# Altium footprint library 1.20-电感.PcbLib: 64 footprints (part 3 of 4)
Each footprint in its own frame and in the unit in brackets; x right, y up, seen from the top. Pads: shape width x height; smd on the part's side, far side on the other; paste and mask are expansions set on the pad; w line width, h text height; cw(c..) or ccw(c..) is an arc to the next point about the centre after c.
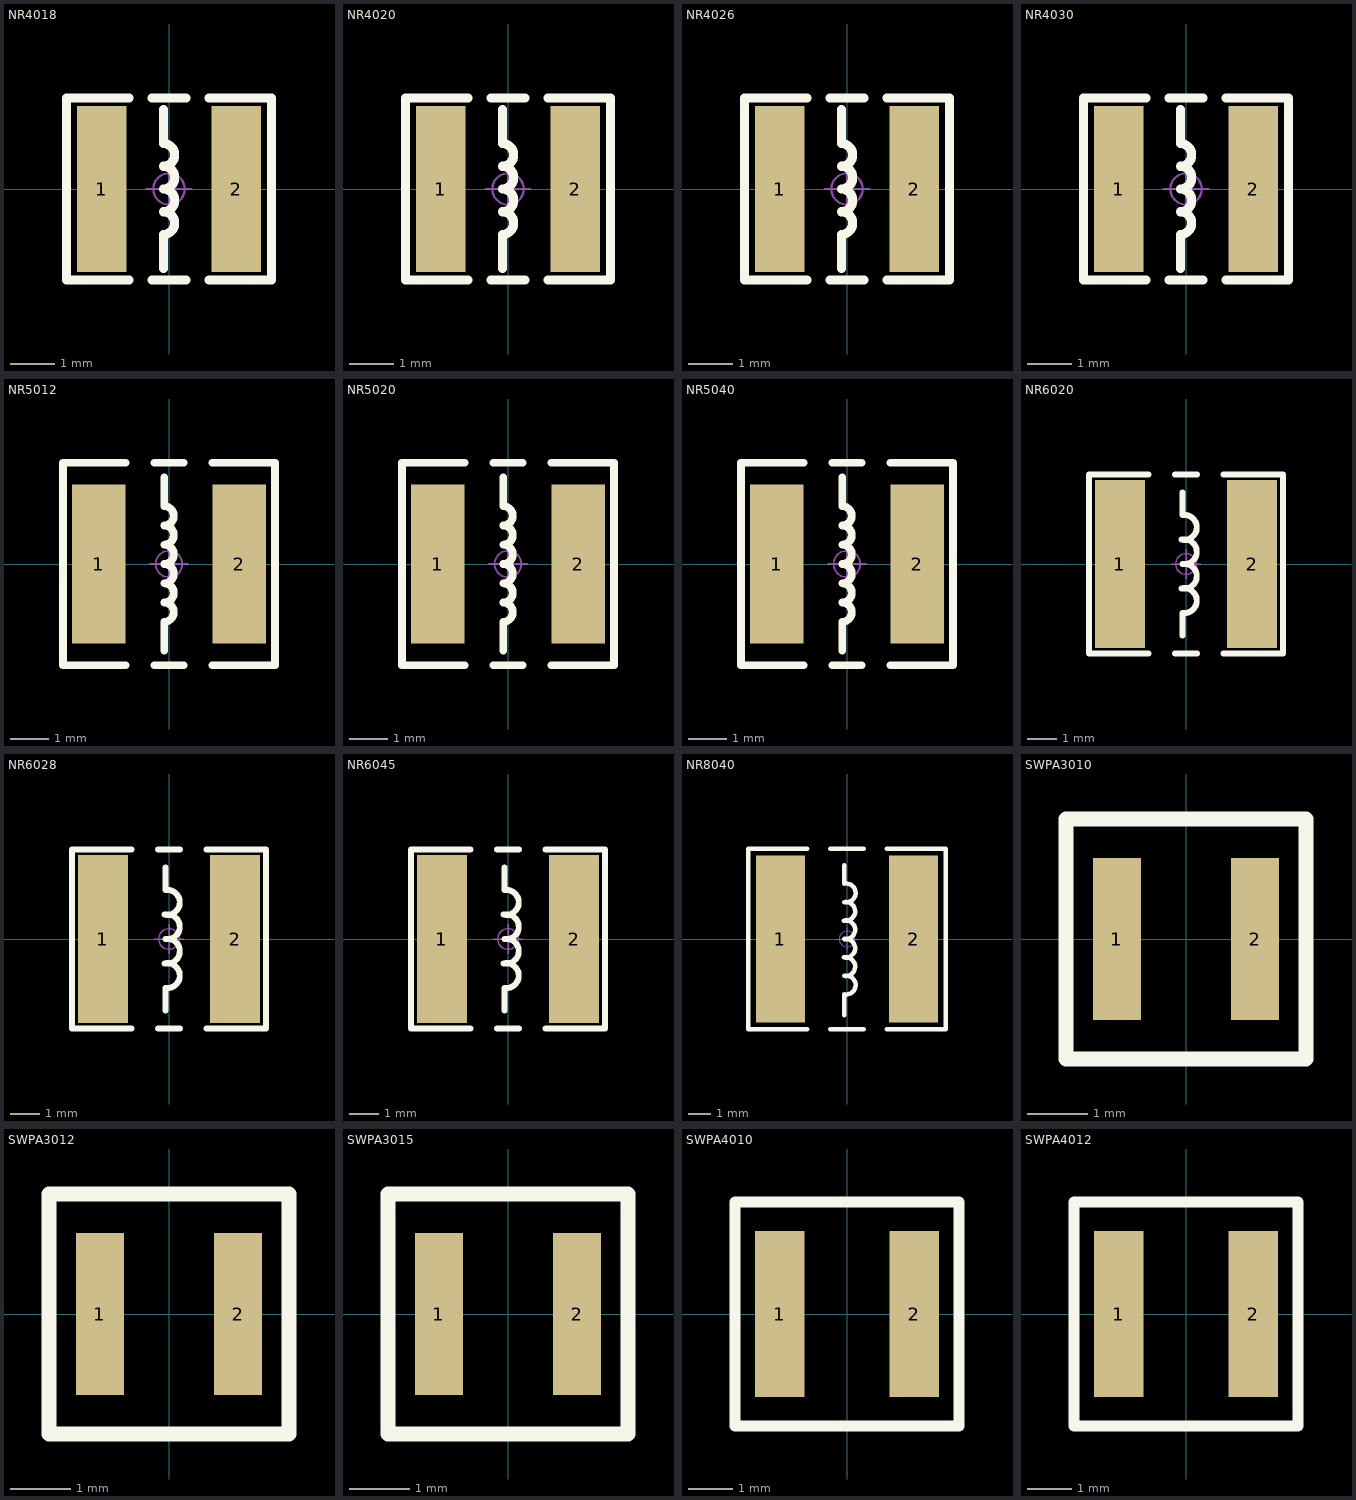
[diagram p2: the footprints below, top view; thin cyan lines are the x and y axes]

## NR4018 [mm] "4.0mm*4.0mm*1.8mm(长*宽*高）      [ PCB学习群514746572 ]"
pads (2):
  rect 1.1x3.7 smd: 1(-1.5,0) 2(1.5,0)
Top Overlay:
  lines w0.203: -0.889,-2.032 -2.286,-2.032 -2.286,2.032 -0.889,2.032 ; -0.381,-2.032 0.381,-2.032 ; -0.381,2.032 0.381,2.032 ; -0.127,-1.778 -0.127,-1.016 ccw(c-0.127,-0.762) -0.127,-0.508 ccw(c-0.127,-0.254) -0.127,0 ccw(c-0.127,0.254) -0.127,0.508 ccw(c-0.127,0.762) -0.127,1.016 -0.127,1.778 ; 0.889,-2.032 2.286,-2.032 2.286,2.032 0.889,2.032
Mechanical 15:
  circle w0.05: c0,0 r0.35
  lines w0.05: -0.5,0 0.5,0 ; 0,-0.5 0,0.5
3D body "NR4018.STEP": height 1.9, standoff 0, extent -2,-2 2,2

## NR4020 [mm] "4.0mm*4.0mm*2.0mm(长*宽*高）      [ PCB学习群514746572 ]"
pads (2):
  rect 1.1x3.7 smd: 1(-1.5,0) 2(1.5,0)
Top Overlay:
  lines w0.203: -0.889,-2.032 -2.286,-2.032 -2.286,2.032 -0.889,2.032 ; -0.381,-2.032 0.381,-2.032 ; -0.381,2.032 0.381,2.032 ; -0.127,-1.778 -0.127,-1.016 ccw(c-0.127,-0.762) -0.127,-0.508 ccw(c-0.127,-0.254) -0.127,0 ccw(c-0.127,0.254) -0.127,0.508 ccw(c-0.127,0.762) -0.127,1.016 -0.127,1.778 ; 0.889,-2.032 2.286,-2.032 2.286,2.032 0.889,2.032
Mechanical 15:
  circle w0.05: c0,0 r0.35
  lines w0.05: -0.5,0 0.5,0 ; 0,-0.5 0,0.5
3D body "NR4020.STEP": height 2.1, standoff 0, extent -2,-2 2,2

## NR4026 [mm] "4.0mm*4.0mm*2.6mm(长*宽*高）      [ PCB学习群514746572 ]"
pads (2):
  rect 1.1x3.7 smd: 1(-1.5,0) 2(1.5,0)
Top Overlay:
  lines w0.203: -0.889,-2.032 -2.286,-2.032 -2.286,2.032 -0.889,2.032 ; -0.381,-2.032 0.381,-2.032 ; -0.381,2.032 0.381,2.032 ; -0.127,-1.778 -0.127,-1.016 ccw(c-0.127,-0.762) -0.127,-0.508 ccw(c-0.127,-0.254) -0.127,0 ccw(c-0.127,0.254) -0.127,0.508 ccw(c-0.127,0.762) -0.127,1.016 -0.127,1.778 ; 0.889,-2.032 2.286,-2.032 2.286,2.032 0.889,2.032
Mechanical 15:
  circle w0.05: c0,0 r0.35
  lines w0.05: -0.5,0 0.5,0 ; 0,-0.5 0,0.5
3D body "NR4026.STEP": height 2.7, standoff 0, extent -2,-2 2,2

## NR4030 [mm] "4.0mm*4.0mm*3.0mm(长*宽*高）      [ PCB学习群514746572 ]"
pads (2):
  rect 1.1x3.7 smd: 1(-1.5,0) 2(1.5,0)
Top Overlay:
  lines w0.203: -0.889,-2.032 -2.286,-2.032 -2.286,2.032 -0.889,2.032 ; -0.381,-2.032 0.381,-2.032 ; -0.381,2.032 0.381,2.032 ; -0.127,-1.778 -0.127,-1.016 ccw(c-0.127,-0.762) -0.127,-0.508 ccw(c-0.127,-0.254) -0.127,0 ccw(c-0.127,0.254) -0.127,0.508 ccw(c-0.127,0.762) -0.127,1.016 -0.127,1.778 ; 0.889,-2.032 2.286,-2.032 2.286,2.032 0.889,2.032
Mechanical 15:
  circle w0.05: c0,0 r0.35
  lines w0.05: -0.5,0 0.5,0 ; 0,-0.5 0,0.5
3D body "NR4030.STEP": height 3.1, standoff 0, extent -2,-2 2,2

## NR5012 [mm] "5.0mm*5.0mm*1.2mm(长*宽*高）      [ PCB学习群514746572 ]"
pads (2):
  rect 1.4x4.2 smd: 1(-1.85,0) 2(1.85,0)
Top Overlay:
  lines w0.203: -1.143,-2.667 -2.794,-2.667 -2.794,2.667 -1.143,2.667 ; -0.381,-2.667 0.381,-2.667 ; -0.381,2.667 0.381,2.667 ; -0.127,-2.286 -0.127,-1.524 ccw(c-0.127,-1.27) -0.127,-1.016 ccw(c-0.127,-0.762) -0.127,-0.508 ccw(c-0.127,-0.254) -0.127,0 ccw(c-0.127,0.254) -0.127,0.508 ccw(c-0.127,0.762) -0.127,1.016 ccw(c-0.127,1.27) -0.127,1.524 -0.127,2.286 ; 1.143,-2.667 2.794,-2.667 2.794,2.667 1.143,2.667
Mechanical 15:
  circle w0.05: c0,0 r0.35
  lines w0.05: -0.5,0 0.5,0 ; 0,-0.5 0,0.5
3D body "NR5012.STEP": height 1.3, standoff 0, extent -2.5,-2.5 2.5,2.5

## NR5020 [mm] "5.0mm*5.0mm*2.0mm(长*宽*高）      [ PCB学习群514746572 ]"
pads (2):
  rect 1.4x4.2 smd: 1(-1.85,0) 2(1.85,0)
Top Overlay:
  lines w0.203: -1.143,-2.667 -2.794,-2.667 -2.794,2.667 -1.143,2.667 ; -0.381,-2.667 0.381,-2.667 ; -0.381,2.667 0.381,2.667 ; -0.127,-2.286 -0.127,-1.524 ccw(c-0.127,-1.27) -0.127,-1.016 ccw(c-0.127,-0.762) -0.127,-0.508 ccw(c-0.127,-0.254) -0.127,0 ccw(c-0.127,0.254) -0.127,0.508 ccw(c-0.127,0.762) -0.127,1.016 ccw(c-0.127,1.27) -0.127,1.524 -0.127,2.286 ; 1.143,-2.667 2.794,-2.667 2.794,2.667 1.143,2.667
Mechanical 15:
  circle w0.05: c0,0 r0.35
  lines w0.05: -0.5,0 0.5,0 ; 0,-0.5 0,0.5
3D body "NR5020.STEP": height 2.1, standoff 0, extent -2.5,-2.5 2.5,2.5

## NR5040 [mm] "5.0mm*5.0mm*4.0mm(长*宽*高）      [ PCB学习群514746572 ]"
pads (2):
  rect 1.4x4.2 smd: 1(-1.85,0) 2(1.85,0)
Top Overlay:
  lines w0.203: -1.143,-2.667 -2.794,-2.667 -2.794,2.667 -1.143,2.667 ; -0.381,-2.667 0.381,-2.667 ; -0.381,2.667 0.381,2.667 ; -0.127,-2.286 -0.127,-1.524 ccw(c-0.127,-1.27) -0.127,-1.016 ccw(c-0.127,-0.762) -0.127,-0.508 ccw(c-0.127,-0.254) -0.127,0 ccw(c-0.127,0.254) -0.127,0.508 ccw(c-0.127,0.762) -0.127,1.016 ccw(c-0.127,1.27) -0.127,1.524 -0.127,2.286 ; 1.143,-2.667 2.794,-2.667 2.794,2.667 1.143,2.667
Mechanical 15:
  circle w0.05: c0,0 r0.35
  lines w0.05: -0.5,0 0.5,0 ; 0,-0.5 0,0.5
3D body "NR5040.STEP": height 4.1, standoff 0, extent -2.5,-2.5 2.5,2.5

## NR6020 [mm] "6.0mm*6.0mm*2.0mm(长*宽*高）      [ PCB学习群514746572 ]"
pads (2):
  rect 1.7x5.7 smd: 1(-2.25,0) 2(2.25,0)
Top Overlay:
  lines w0.203: -1.27,-3.048 -3.302,-3.048 -3.302,3.048 -1.27,3.048 ; -0.381,-3.048 0.381,-3.048 ; -0.381,3.048 0.381,3.048 ; -0.127,-2.424 -0.127,-1.662 ccw(c-0.057,-1.244) -0.149,-0.831 ccw(c-0.057,-0.418) -0.127,0 ccw(c-0.057,0.418) -0.149,0.831 ccw(c-0.057,1.244) -0.127,1.662 -0.127,2.424 ; 1.27,-3.048 3.302,-3.048 3.302,3.048 1.27,3.048
Mechanical 15:
  circle w0.05: c0,0 r0.35
  lines w0.05: -0.5,0 0.5,0 ; 0,-0.5 0,0.5
3D body "NR6020.STEP": height 2.1, standoff 0, extent -3,-3 3,3

## NR6028 [mm] "6.0mm*6.0mm*2.8mm(长*宽*高）      [ PCB学习群514746572 ]"
pads (2):
  rect 1.7x5.7 smd: 1(-2.25,0) 2(2.25,0)
Top Overlay:
  lines w0.203: -1.27,-3.048 -3.302,-3.048 -3.302,3.048 -1.27,3.048 ; -0.381,-3.048 0.381,-3.048 ; -0.381,3.048 0.381,3.048 ; -0.127,-2.424 -0.127,-1.662 ccw(c-0.057,-1.244) -0.149,-0.831 ccw(c-0.057,-0.418) -0.127,0 ccw(c-0.057,0.418) -0.149,0.831 ccw(c-0.057,1.244) -0.127,1.662 -0.127,2.424 ; 1.27,-3.048 3.302,-3.048 3.302,3.048 1.27,3.048
Mechanical 15:
  circle w0.05: c0,0 r0.35
  lines w0.05: -0.5,0 0.5,0 ; 0,-0.5 0,0.5
3D body "NR6028.STEP": height 2.9, standoff 0, extent -3,-3 3,3

## NR6045 [mm] "6.0mm*6.0mm*4.5mm(长*宽*高）      [ PCB学习群514746572 ]"
pads (2):
  rect 1.7x5.7 smd: 1(-2.25,0) 2(2.25,0)
Top Overlay:
  lines w0.203: -1.27,-3.048 -3.302,-3.048 -3.302,3.048 -1.27,3.048 ; -0.381,-3.048 0.381,-3.048 ; -0.381,3.048 0.381,3.048 ; -0.127,-2.424 -0.127,-1.662 ccw(c-0.057,-1.244) -0.149,-0.831 ccw(c-0.057,-0.418) -0.127,0 ccw(c-0.057,0.418) -0.149,0.831 ccw(c-0.057,1.244) -0.127,1.662 -0.127,2.424 ; 1.27,-3.048 3.302,-3.048 3.302,3.048 1.27,3.048
Mechanical 15:
  circle w0.05: c0,0 r0.35
  lines w0.05: -0.5,0 0.5,0 ; 0,-0.5 0,0.5
3D body "NR6045.STEP": height 4.6, standoff 0, extent -3,-3 3,3

## NR8040 [mm] "8.0mm*8.0mm*4.0mm(长*宽*高）      [ PCB学习群514746572 ]"
pads (2):
  rect 2.2x7.5 smd: 1(-3,0) 2(3,0)
Top Overlay:
  lines w0.203: -1.778,-4.064 -4.445,-4.064 -4.445,4.064 -1.778,4.064 ; -0.762,-4.064 0.762,-4.064 ; -0.762,4.064 0.762,4.064 ; -0.127,-3.44 -0.127,-2.492 ; -0.127,2.492 -0.127,3.313 ; -0.105,-2.492 ccw(c-0.035,-2.075) -0.127,-1.662 ccw(c-0.057,-1.244) -0.149,-0.831 ccw(c-0.057,-0.418) -0.127,0 ccw(c-0.057,0.418) -0.149,0.831 ccw(c-0.057,1.244) -0.127,1.662 ccw(c-0.035,2.075) -0.105,2.492 ; 1.778,-4.064 4.445,-4.064 4.445,4.064 1.778,4.064
Mechanical 15:
  circle w0.05: c0,0 r0.35
  lines w0.05: -0.5,0 0.5,0 ; 0,-0.5 0,0.5
3D body "NR8040.STEP": height 4.1, standoff 0, extent -4,-4 4,4

## SWPA3010 [mm] "轮廓3mm*3mm ，焊盘间距1.5mm      [ PCB学习群514746572 ]"
height 1
pads (2):
  rect 0.8x2.7 smd: 1(-1.15,0) 2(1.15,0)
Top Overlay:
  lines w0.254: -2,-2 -2,2 0,2 2,2 2,-2 -2,-2
3D body "3010.stp": height 1.05, standoff 0.03, extent -1.5,-1.5 1.5,1.5

## SWPA3012 [mm] "轮廓3mm*3mm ，焊盘间距1.5mm      [ PCB学习群514746572 ]"
height 1.2
pads (2):
  rect 0.8x2.7 smd: 1(-1.15,0) 2(1.15,0)
Top Overlay:
  lines w0.254: -2,-2 2,-2 2,2 0,2 -2,2 -2,-2
3D body "3012.STEP": height 1.2, standoff -0.02, extent -1.5,-1.5 1.5,1.5

## SWPA3015 [mm] "轮廓3mm*3mm ，焊盘间距1.5mm      [ PCB学习群514746572 ]"
height 1.5
pads (2):
  rect 0.8x2.7 smd: 1(-1.15,0) 2(1.15,0)
Top Overlay:
  lines w0.254: -2,-2 2,-2 2,2 0,2 -2,2 -2,-2
3D body "3015.STEP": height 1.5, standoff -0.02, extent -1.5,-1.5 1.5,1.5

## SWPA4010 [mm] "轮廓4mm*4mm ，焊盘间距1.9mm      [ PCB学习群514746572 ]"
height 1
pads (2):
  rect 1.1x3.7 smd: 1(-1.5,0) 2(1.5,0)
Top Overlay:
  lines w0.254: -2.5,-2.5 -2.5,2.5 2.5,2.5 2.5,-2.5 -2.5,-2.5
3D body "4010.STEP": height 1, standoff -0.02, extent -2,-2 2,2

## SWPA4012 [mm] "轮廓4mm*4mm ，焊盘间距1.9mm      [ PCB学习群514746572 ]"
height 1.2
pads (2):
  rect 1.1x3.7 smd: 1(-1.5,0) 2(1.5,0)
Top Overlay:
  lines w0.254: -2.5,-2.5 -2.5,2.5 2.5,2.5 2.5,-2.5 -2.5,-2.5
3D body "4012.STEP": height 1.2, standoff -0.02, extent -2,-2 2,2